# Altium schematic symbol library lib_datalogger.SchLib: 1246 symbols (part 15 of 16) (continued)
## CMP-00023-00001-2
designator U?, comment DS1307ZN+
I2C Real-Time Clock, 4.5 to 5.5 V, -40 to 85 degC, 8-Pin SOIC, RoHS, Tube; Manufacturer: Maxim; Max Supply Voltage: 5.5V; Min Supply Voltage: 4.5V; Outputs: 1; Package Version: Rev. D, 10/2012; Clock Frequency: 32.768KHz; Interface: Serial; Max Operating Temperature: 85°C; RoHS Compliant: True; Packaging: Rail/Tube; Manufacturer URL: http://www.maximintegrated.com/; Package Quantity: 100; Datasheet URL: http://datasheets.maximintegrated.com/en/ds/DS1307.pdf; Package Description: 8-Pin Small-Outline IC, Narrow (0.15in) (S8-2), Body 4.90 x 3.90 mm, Pitch 1.27 mm; Mounting Technology: SM; Package Reference: S8-2; Pins: 8; Case/Package: SOIC; Datasheet Version: Mar-15; Package URL: http://pdfserv.maximintegrated.com/package_dwgs/21-0041.PDF; Min Operating Temperature: -40°C
footprint MAXM-S8-2_L (SOIC, 8-Leads, Body 5x4mm, Pitch 1.27mm, IPC High Density)
footprint MAXM-S8-2_N (SOIC, 8-Leads, Body 5x4mm, Pitch 1.27mm, IPC Medium Density)
footprint MAXM-S8-2_M (SOIC, 8-Leads, Body 5x4mm, Pitch 1.27mm, IPC Low Density)
pins: 1 X1 "Connections for Standard 32.768kHz Quartz Crystal.", 2 X2 "Connections for Standard 32.768kHz Quartz Crystal.", 3 VBAT (power) "Backup Supply Input for Any Standard 3V Lithium Cell or Other Energy Source.", 4 GND (power) "Ground", 5 SDA (io) "Serial Data Input/Output.", 6 SCL (in) "Serial Clock Input.", 7 SQW/OUT (oc) "Square Wave/Output Driver.", 8 VCC (power) "Primary Power Supply."

## CMP-00023-00002-2
designator U?, comment LM555CM
Highly Stable 555 Timer for Generating Accurate Time Delays and Oscillation, 4.5 to 16 V, 0 to 70 degC, 8-Pin SOIC (D), Tube; Manufacturer: Texas Instruments (TI); Package Version: 4040047-3/M, 06/2011; Frequency: 100kHz; Max Supply Voltage: 16V; Max Ouput Current: -200mA; Min Supply Voltage: 4.5V; Power: 1.18W; Nominal Supply Current: 3mA; Channels: 1; Manufacturer URL: http://www.ti.com/; Pins: 8; Packaging: Rail/Tube; Datasheet Version: SNAS548D, 01/2015; RoHS Compliant: True; Package URL: http://www.ti.com/lit/ml/msoi002j/msoi002j.pdf; Package Reference: D0008A; Package Quantity: 95; Datasheet URL: http://www.ti.com/lit/ds/symlink/lm555.pdf; Min Operating Temperature: 0°C; Mounting Technology: SM; Max Operating Temperature: 70°C; Case/Package: SOIC; Package Description: 8-Pin Small Outline Integrated Circuit, Body 4.9 x 3.9 mm, Pitch 1.27 mm
footprint D0008A_L (SOIC, 8-Leads, Body 5x4mm, Pitch 1.27mm, IPC High Density)
footprint D0008A_N (SOIC, 8-Leads, Body 5x4mm, Pitch 1.27mm, IPC Medium Density)
footprint D0008A_M (SOIC, 8-Leads, Body 5x4mm, Pitch 1.27mm, IPC Low Density)
pins: 1 GND (power) "Ground reference voltage", 2 TRIGGER "Responsible for transition of the flip-flop from set to reset. The output of the timer depends on the amplitude of the external trigger pulse applied to this pin", 3 OUTPUT (out) "Output driven waveform", 4 RESET (in) "Negative pulse applied to this pin to disable or reset the timer. When not used for reset purposes, it should be connected to VCC to avoid false triggering", 5 CONTROL VOLTAGE (in) "Controls the threshold and trigger levels. It determines the pulse width of the output waveform. An external voltage applied to this pin can also be used to modulate the output waveform", 6 THRESHOLD "Compares the voltage applied to the terminal with a reference voltage of 2/3 Vcc. The amplitude of voltage applied to this terminal is responsible for the set state of the flip-flop", 7 DISCHARGE (oc) "Open collector output which discharges a capacitor between intervals (in phase with output). It toggles the output from high to low when voltage reaches 2/3 of the supply voltage", 8 V+ (power) "Supply voltage with respect to GND"

## CMP-023-000002-2
designator ANT?, comment ANTENA BL
Source: mits.SchLib; Design Item ID: ANTENA BL
footprint BL ANTENA ST
footprint BL ANTENA ST
pins: 1

## CMP-023-000003-1
designator MH?, comment PAD 5.5MM  (no BOM)
Design Item ID: PAD 5.5MM; Source: mits.SchLib
footprint PAD_5.5mm
footprint PAD_5.5mm
pins: HOLE "PAD"

## CMP-023-000004-1
designator U?, comment genericTLS
Source: mits.SchLib; Design Item ID: genericTLS
footprint genericTLS
footprint genericTLS

## CMP-023-000006-1
designator J?, comment JUMPER 0603  (no BOM)
Source: mits.SchLib; Design Item ID: JUMPER 0603
footprint JUMPER-0805 (Chip Capacitor)
footprint JUMPER-0603 (Chip Resistor; Body 1.6 x 0.8 mm (LxW typ))
pins: 1, 2

## CMP-023-000007-1
designator J?, comment JUMPER 0805  (no BOM)
JUMPER 0603; Source: mits.SchLib; Design Item ID: JUMPER 0805
footprint JUMPER-0805 (Chip Capacitor)
footprint JUMPER-0805 (Chip Capacitor)
pins: 1, 2

## CMP-023-000009-1
designator M?, comment BANDEJA RS-FA  (no BOM)
Manufacturer: MOBIT; Part#: BANDEJA RS-FA; Source: mits.SchLib; Design Item ID: BANDEJA RS-FA
footprint BANDEJA_RS3-FA
footprint BANDEJA_RS3-FA
1 alternate drawing of the same symbol

## CMP-023-000010-1
designator CON?, comment CONN_DG243-7.5
Design Item ID: CONN_DG243-7.5; Source: mits.SchLib
footprint CONN_TBL005A-500
footprint CONN_TBL005A-500
pins: 1_A 1, 1_B 1, 2_A 2, 2_B 2, 3_A 3, 3_B 3, 4_A 4, 4_B 4, 5_A 5, 5_B 5

## CMP-023-000011-1
designator U?, comment raspberry pi 3
Design Item ID: raspberry pi 3; Source: mits.SchLib
footprint raspberry
footprint raspberry

## CMP-023-000012-1
designator J?, comment JUMPER 0805 3POS  (no BOM)
JUMPER 0805; Design Item ID: JUMPER 0805 3POS; Source: mits.SchLib
footprint JUMPER-3POS (Chip Capacitor)
footprint JUMPER-3POS (Chip Capacitor)
pins: 1, 2, 3

## CMP-023-000018-1
designator U?, comment IC ESP32-WROOM-32D
WIFI Module WIFI Modules RoHS; Manufacturer_Name: Espressif Systems; Data Rate: 150Mbps; Operating Supply Voltage: 3.6V; Frequency: 2.5GHz; Sensitivity: -98dBm; Min Operating Temperature: -40°C; Manufacturer_Part_Number: ESP32-WROOM-32D; Mouser Part Number: N/A; Max Operating Temperature: 85°C; Mount: Surface Mount; Height: 3.1mm; Datasheet Link: https://www.mouser.com/datasheet/2/891/esp32-wroom-32d_esp32-wroom-32u_datasheet_en-1365844.pdf; Package Quantity: 550; Packaging: Cut Tape; Supplier Unit Price 1: 2.3204; Design Item ID: IC ESP32-WROOM-32D; Case/Package: SMD/SMT; Mouser Price/Stock: https://www.mouser.co.uk/ProductDetail/Espressif-Systems/ESP32-WROOM-32D/?qs=MLItCLRbWszx2KabkKPu5A%3D%3D; Source: mits.SchLib; Weight: 0.088185oz; Manufacturer Part Number 1: ESP32-WROOM-32; Category: RF Receivers, Transceivers; Manufacturer 1: Espressif Systems
footprint ESP32WROOM32D
footprint ESP32WROOM32D
pins: 1 GND_1, 2 3V3, 3 EN, 4 SENSOR_VP, 5 SENSOR_VN, 6 IO34, 7 IO35, 8 IO32, 9 IO33, 10 IO25, 11 IO26, 12 IO27, 13 IO14, 14 IO12, 15 GND_2, 16 IO13, 17 SD2, 18 SD3, 19 CMD, 20 CLK, 21 SD0, 22 SD1, 23 IO15, 24 IO2, 25 IO0, 26 IO4, 27 IO16, 28 IO17, 29 IO5, 30 IO18, 31 IO19, 32 NC, 33 IO21, 34 RXD0, 35 TXD0, 36 IO22, 37 IO23, 38 GND_3, 39 GND_4

## CMP-023-000020-1
designator MH?, comment OBILONGO 4MMX11.5MM  (no BOM)
Source: mits.SchLib; Design Item ID: OBILONGO 4MMX11.5MM
footprint OBILONGO_4mmX10.5mm
footprint OBILONGO_4mmX10.5mm
pins: HOLE "PAD"

## CMP-023-000021-1
designator ARJ?, comment CONNECTOR 5 JUMPERS ARRAY  (no BOM)
Design Item ID: CONNECTOR 5 JUMPERS ARRAY; Source: mits.SchLib
footprint JUMPER-0603 (Chip Resistor; Body 1.6 x 0.8 mm (LxW typ))
footprint JUMPER-0603 (Chip Resistor; Body 1.6 x 0.8 mm (LxW typ))
pins: 1, 2, 3, 4, 5, 6, 7, 8, 9, 10

## CMP-023-000022-2
designator J?, comment JUMPER PLUG 2POS DOUBLE ROW
Manufacturer Part Number: XG8T-0231; Manufacturer: Omron Electronics Inc-EMC Div; Number of Positions: 2; Contact Length - Mating: 0.169" (4.30mm); Material Flammability Rating: UL94 V-0; Overall Contact Length: 0.386" (9.80mm); Contact Length - Post: 0.118" (3.00mm); Current Rating: 2A; Connector Type: Header; Number of Positions Loaded: All; Style: Board to Board or Cable; Row Spacing - Mating: 0.100" (2.54mm); Voltage Rating: 300V; Shrouding: Unshrouded; Contact Finish - Mating: Gold; Applications: -; Operating Temperature: -55°C ~ 105°C; Manufacturer Part Number 2: MTP125-1102S1; Contact Material: Brass, Nickel; Termination: Solder; Source: mits.SchLib; Features: -; Pitch - Mating: -; Design Item ID: JUMPER PLUG 2POS DOUBLE ROW; Contact Finish Thickness - Post: -; Part Status: Active; Ingress Protection: -; Packaging: Bulk; RoHS: RoHS Compliant; Mounting Type: Through Hole; Contact Type: Male Pin; Insulation Color: Black; Manufacturer 2: MINTRON; Contact Finish Thickness - Mating: 5.9µin (0.15µm); ComponentLink1URL: http://www.omron.com/ecb/products/pdf/en-xj8.pdf; Fastening Type: -; Category: Connectors, Interconnects; Supplier Unit Price 2: 0.0063; Insulation Material: Polybutylene Terephthalate (PBT), Glass Filled; Number of Rows: 2; ComponentLink1Description: http://www.omron.com/ecb/products/pdf/en-xj8.pdf; Contact Shape: Square; Pricing 1: 1=0.19, 10=0.18, 100=0.1245, 500=0.10534, 1000=0.08618, 5000=0.07661, 10000=0.06943 (USD); Insulation Height: 0.098" (2.50mm); Stock 1: 16469; Contact Finish - Post: Tin; Mated Stacking Heights: -
footprint JUMPER 2POS 2.54MM (Connector; Header; 2 Position)
footprint JUMPER 2POS 2.54MM (Connector; Header; 2 Position)
pins: 1 C1, 2 C2

## CMP-023-000024-1
designator U?, comment COPO  LIGHT CONTROLLER COVER
LED Lighting Fixture Accessories; COVER; LIGHT CONTROLLER; 76MM DIA; MEDIUM; Manufacturer Part Number: 2213748-1; Manufacturer: TE Connectivity; REACH SVHC: Unknown; RoHS: Yes; ComponentLink2URL: http://www.farnell.com/datasheets/2079116.pdf?src-supplier=Element14; ComponentLink1Description: https://www.te.com/commerce/DocumentDelivery/DDEController?Action=srchrtrv&amp;DocNm=2213748&amp;DocType=Customer+Drawing&amp;DocLang=English&src-supplier=Digi-Key; Source: mits.SchLib; Stock 1: 14; ComponentLink1URL: https://www.te.com/commerce/DocumentDelivery/DDEController?Action=srchrtrv&amp;DocNm=2213748&amp;DocType=Customer+Drawing&amp;DocLang=English&src-supplier=Digi-Key; Design Item ID: COPO  LIGHT CONTROLLER COVER; ComponentLink2Description: http://www.farnell.com/datasheets/2079116.pdf?src-supplier=Element14; Pricing 1: 1=8,03000, 10=5,82600, 100=4,81440, 500=4,33940 (USD); Category: Optoelectronics; Housing Color: Grey

## CMP-023-000025-1
designator Fs?, comment FUSE 250V 2A IEC FA LBC 5X20
Manufacturer: Littelfuse Inc; Part#: 0217002.HXP; eVendorPrice: 0,35; eVendor#: F2393-ND; eVendor: Digikey; MSRP: 0,1456; MOQ: 2500; Observação: --; Datasheet: http://www.littelfuse.com/~/media/electronics/datasheets/fuses/littelfuse_fuse_217_datasheet.pdf.pdf; Design Item ID: FUSE 250V 2A IEC FA LBC 5X20; Source: mits.SchLib
footprint FUSE
footprint FUSE

## CMP-023-000026-1
designator RT?, comment PTC RESETTABLE 16V 3A RADIAL
Manufacturer: Littelfuse; Manufacturer Part Number: RF2775-000; Trip Current: 6A; Time to Trip: 10.8s; Approvals: UL,TUV,cURus; Max Current Rating: 100A; ComponentLink1Description: http://www.te.com/commerce/DocumentDelivery/DDEController?Action=srchrtrv&DocNm=SCD25175&DocType=SS&DocLang=EN&src-supplier=Digi-Key; Height - Seated (Max): 0.65inch; Max Operating Temperature: 125°C; Mount: Through Hole; Length: 0.449inch; ComponentLink2URL: https://media.digikey.com/pdf/Data%20Sheets/Bel%20Fuse%20PDFs/0ZRN_Series.pdf?src-supplier=Digi-Key; Case/Package: Radial; Lead Pitch: 0.199inch; Pricing 2: 1=0,46000, 5=0,45000, 10=0,43700, 50=0,36720, 100=0,30490, 250=0,27720, 500=0,23562, 1000=0,20790, 5000=0,18711 (USD); Packaging: Tape and Reel; Hold Current: 3A; Min Operating Temperature: -40°C; Pricing 1: 1=0,53000, 5=0,51600, 10=0,50100, 50=0,42140, 100=0,34980, 250=0,31800, 500=0,27030 (USD); Stock 1: 1100; ComponentLink1URL: http://www.te.com/commerce/DocumentDelivery/DDEController?Action=srchrtrv&DocNm=SCD25175&DocType=SS&DocLang=EN&src-supplier=Digi-Key; Width: 0.118inch; Design Item ID: PTC RESETTABLE 16V 3A RADIAL; RoHS: Yes; Source: mits.SchLib; Stock 2: 2912; ComponentLink2Description: https://media.digikey.com/pdf/Data%20Sheets/Bel%20Fuse%20PDFs/0ZRN_Series.pdf?src-supplier=Digi-Key; Category: PTC Resettable Fuses
footprint PTC_TH (Jumper Wire; 2 Leads)
footprint PTC_TH 5.1-12 (Jumper Wire; 2 Leads)
pins: 1, 2
text: t°

## CMP-023-000027-1
designator RT?, comment PTC RESETTABLE 30V 3A RADIAL
PTC RESET FUSE 30V 3A RADIAL; Manufacturer: Littelfuse; Manufacturer Part Number: RF2775-000; Time to Trip: 10.8s; Trip Current: 6A; Max Current Rating: 100A; ComponentLink1Description: http://www.te.com/commerce/DocumentDelivery/DDEController?Action=srchrtrv&DocNm=SCD25175&DocType=SS&DocLang=EN&src-supplier=Digi-Key; Case/Package: Radial; Lead Pitch: 0.199inch; RoHS: Yes; Height - Seated (Max): 0.65inch; Source: mits.SchLib; Hold Current: 3A; Packaging: Tape and Reel; Design Item ID: PTC RESETTABLE 30V 3A RADIAL; Stock 1: 1100; ComponentLink1URL: http://www.te.com/commerce/DocumentDelivery/DDEController?Action=srchrtrv&DocNm=SCD25175&DocType=SS&DocLang=EN&src-supplier=Digi-Key; Category: PTC Resettable Fuses; Length: 0.449inch; Width: 0.118inch; Pricing 1: 1=0,53000, 5=0,51600, 10=0,50100, 50=0,42140, 100=0,34980, 250=0,31800, 500=0,27030 (USD); Mount: Through Hole
footprint PTC_TH (Jumper Wire; 2 Leads)
footprint PTC_TH 5.1-12 (Jumper Wire; 2 Leads)
pins: 1, 2
text: t°

## CMP-023-000028-1
designator RT?, comment PTC RESETTABLE 30V 6A RADIAL
Ptc Reset Fuse 30V 6A Radial; Manufacturer Part Number: RF2754-000; Manufacturer: Littelfuse; Time to Trip: 16s; Max Current Rating: 100A; Trip Current: 12A; Case/Package: Radial; Source: mits.SchLib; Width: 0.118inch; Design Item ID: PTC RESETTABLE 30V 6A RADIAL; RoHS: Yes; Stock 1: 2074; Length: 0.65inch; Packaging: Tape and Reel; Pricing 1: 1=0,82000, 5=0,79600, 10=0,77200, 50=0,64920, 100=0,53900, 250=0,49000, 500=0,41650 (USD); ComponentLink1Description: http://www.te.com/commerce/DocumentDelivery/DDEController?Action=srchrtrv&DocNm=CLP00011&DocType=CS&DocLang=English&src-supplier=Digi-Key; Category: PTC Resettable Fuses; Height - Seated (Max): 1.031inch; Lead Pitch: 0.4inch; ComponentLink1URL: http://www.te.com/commerce/DocumentDelivery/DDEController?Action=srchrtrv&DocNm=CLP00011&DocType=CS&DocLang=English&src-supplier=Digi-Key; Hold Current: 6A; Mount: Through Hole
footprint PTC_TH (Jumper Wire; 2 Leads)
footprint PTC_TH 5.1%2F10.2 - 23 (Jumper Wire; 2 Leads)
pins: 1, 2
text: t°

## CMP-023-000029-1
designator IPD?, comment IC RF FILTER LFB182G45BG2D280
Signal Conditioning 2.4GHz Bandpass TI CC253x CC254x; Manufacturer: Murata; Bandwidth: 2.45GHz; Impedance: 50R; Insertion Loss: 0.75dB; Frequency: 2.4GHz; Package Quantity: 4000; Case/Package: 0603; Source: mits.SchLib; Series: LFB; Pricing 1: 1=0,29090, 10=0,21420, 30=0,20010, 100=0,18590, 500=0,17970, 1000=0,17670, 1=0,28040, 10=0,20650, 30=0,19280, 100=0,17920, 500=0,17320, 1000=0,17030, 1=1,45420, 10=1,07080, 30=1,00020, 100=0,92950, 500=0,89810, 1000=0,88310, 1=1,40180, 10=1,03220, 30=0,96410, 100=0,89600, 500=0,86580, 1000=0,85130, 1=0,18800, 10=0,13840, 30=0,12930, 100=0,12020, 500=0,11610, 1000=0,11420, 1=0,16120, 10=0,11870, 30=0,11090, 100=0,10300, 500=0,09960, 1000=0,09790, 1=1,72710, 10=1,27180, 30=1,18790, 100=1,10400, 500=1,06670, 1000=1,04890, 1=24,36720, 10=17,94380, 30=16,76000, 100=15,57620, 500=15,05000, 1000=14,79790, 1=0,92180, 10=0,67880, 30=0,63400, 100=0,58920, 500=0,56930, 1000=0,55980, 1=16,89790, 10=12,44350, 30=11,62250, 100=10,80160, 500=10,43670, 1000=10,26190, 1=1,92070, 10=1,41440, 30=1,32110, 100=1,22780, 500=1,18630, 1000=1,16640, 1=0,29920, 10=0,22030, 30=0,20580, 100=0,19130, 500=0,18480, 1000=0,18170, 1=0,22230, 10=0,16370, 30=0,15290, 100=0,14210, 500=0,13730, 1000=0,13500 (AUD); Radiation Hardening: No; Length: 1.6mm; Width: 800um; Termination: SMD/SMT; RoHS Compliant: Yes; Design Item ID: IC RF FILTER LFB182G45BG2D280; Category: EMI / RFI Components; Manufacturer Part Number: LFB182G45BG2D280; RoHS: Yes; Max Operating Temperature: 85°C; ComponentLink1URL: https://datasheet.ciiva.com/4547/dm-5400-01a-lfb182g45bg2d280-202913-4547754.pdf?src-supplier=Mouser; Packaging: Tape and Reel; Stock 1: 23214; ComponentLink1Description: https://datasheet.ciiva.com/4547/dm-5400-01a-lfb182g45bg2d280-202913-4547754.pdf?src-supplier=Mouser; Min Operating Temperature: -40°C
footprint SMD RF 0603
footprint SMD RF 0603
pins: 1 Unbalanced Port, 2 GND (power), 3 Balanced Port, 4 Balanced Port, 5 GND (power), 6 GND

## CMP-023-000030-1
designator RT?, comment PTC RESETTABLE 16V 15A RADIAL
PTC RESET FUSE 16V 15A RADIAL; Manufacturer: Littelfuse; Manufacturer Part Number: RHEF1500-2; Time to Trip: 20s; Max Current Rating: 100A; Trip Current: 28A; Approvals: UL,CSA,TUV; Pricing 1: 1=1,58000, 5=1,50000, 10=1,42500, 50=1,15000, 100=0,97500, 250=0,95000, 500=0,80000 (USD); ComponentLink1Description: http://www.littelfuse.com/~/media/electronics/datasheets/resettable_ptcs/littelfuse_ptc_rline_catalog_datasheet.pdf.pdf?src-supplier=Digi-Key; Lead Free: Lead Free; Source: mits.SchLib; Length: 28.7mm; ComponentLink1URL: http://www.littelfuse.com/~/media/electronics/datasheets/resettable_ptcs/littelfuse_ptc_rline_catalog_datasheet.pdf.pdf?src-supplier=Digi-Key; ComponentLink3Description: https://www.littelfuse.com/~/media/electronics/product_specifications/resettable_ptcs/littelfuse_ptc_rhef1500_product_specification.pdf.pdf?src-supplier=Digi-Key; Packaging: Cut Tape; RoHS: No; Design Item ID: PTC RESETTABLE 16V 15A RADIAL; Voltage Rating (DC): 16V; ComponentLink2URL: http://www.littelfuse.com/~/media/electronics/product_specifications/resettable_ptcs/littelfuse_ptc_rhef1500_product_specification.pdf.pdf?src-supplier=Digi-Key; Stock 1: 1747; ComponentLink2Description: http://www.littelfuse.com/~/media/electronics/product_specifications/resettable_ptcs/littelfuse_ptc_rhef1500_product_specification.pdf.pdf?src-supplier=Digi-Key; Hold Current: 15A; Category: PTC Resettable Fuses; Min Operating Temperature: -40°C; Case/Package: Radial; Mount: Through Hole; Max Operating Temperature: 125°C; ComponentLink3URL: https://www.littelfuse.com/~/media/electronics/product_specifications/resettable_ptcs/littelfuse_ptc_rhef1500_product_specification.pdf.pdf?src-supplier=Digi-Key
footprint PTC_TH (Jumper Wire; 2 Leads)
footprint PTC_TH 5.1%2F10.2 - 23 (Jumper Wire; 2 Leads)
pins: 1, 2
text: t°

## CMP-023-000031-1
designator RT?, comment PTC RESETTABLE 60V 1.6A RADIAL
PTC RESET FUSE 60V 1.6A RADIAL; Manufacturer Part Number: 0ZRE0200FF1A; Manufacturer: Bel; Time to Trip: 15.6s; Resistance: 130mR; Hold Current: 2.5A; Max Current Rating: 40A; Power Dissipation: 2.5W; Approvals: cULus,TUV; Trip Current: 5A; Termination: Radial; ComponentLink3Description: https://datasheet.ciiva.com/14119/iewickmann-resettables-rld60-en-14119709.pdf?src-supplier=Distrelec; Pricing 2: 1=0,40000, 5=0,38600, 10=0,37400, 50=0,31480, 100=0,26140, 250=0,23760, 500=0,20196, 1000=0,17820, 5000=0,16038 (USD); ComponentLink6Description: https://datasheet.ciiva.com/16409/littelfuse-ptc-60r-16409062.pdf?src-supplier=Future+Electronics; Height: 21.3mm; ComponentLink9Description: https://media.digikey.com/pdf/Data%20Sheets/Bel%20Fuse%20PDFs/0ZRR_Series.pdf?src-supplier=Digi-Key; Lead Free: Lead Free; ComponentLink1Description: https://belfuse.com/resources/0ZRE%20Sep2016.pdf?src-supplier=Digi-Key; Case/Package: Radial; Width: 16.3mm; Mount: Through Hole; ComponentLink2Description: https://datasheet.ciiva.com/326/littelfuse-60r-326981.pdf?src-supplier=Digi-Key; Package Quantity: 1000; Stock 1: 413; Design Item ID: PTC RESETTABLE 60V 1.6A RADIAL; Max Voltage Rating (DC): 60V; ComponentLink3URL: https://datasheet.ciiva.com/14119/iewickmann-resettables-rld60-en-14119709.pdf?src-supplier=Distrelec; Source: mits.SchLib; Category: PTC Resettable Fuses; ComponentLink2URL: https://datasheet.ciiva.com/326/littelfuse-60r-326981.pdf?src-supplier=Digi-Key; ComponentLink6URL: https://datasheet.ciiva.com/16409/littelfuse-ptc-60r-16409062.pdf?src-supplier=Future+Electronics; Min Operating Temperature: -40°C; Thickness: 3.05mm; Current Rating: 40A; ComponentLink5URL: https://datasheet.ciiva.com/326/littelfuse-60r-326806.pdf?src-supplier=Digi-Key; ComponentLink8Description: https://datasheet.ciiva.com/14119/iewickmann-resettables-rld60-en-14119707.pdf?src-supplier=Distrelec; Lead Pitch: 10.2mm; ComponentLink4Description: https://datasheet.ciiva.com/326/littelfuse-60r-326982.pdf?src-supplier=Digi-Key; ComponentLink5Description: https://datasheet.ciiva.com/326/littelfuse-60r-326806.pdf?src-supplier=Digi-Key; Pricing 1: 1=0,55000, 5=0,53600, 10=0,52000, 50=0,43720, 100=0,36300, 250=0,33000, 500=0,28050 (USD); RoHS: No; ComponentLink7URL: https://datasheet.ciiva.com/326/littelfuse-60r-326807.pdf?src-supplier=Digi-Key; ComponentLink4URL: https://datasheet.ciiva.com/326/littelfuse-60r-326982.pdf?src-supplier=Digi-Key; ComponentLink7Description: https://datasheet.ciiva.com/326/littelfuse-60r-326807.pdf?src-supplier=Digi-Key; Max Operating Temperature: 85°C; Working Voltage: 60V; Stock 2: 906; ComponentLink1URL: https://belfuse.com/resources/0ZRE%20Sep2016.pdf?src-supplier=Digi-Key; ComponentLink8URL: https://datasheet.ciiva.com/14119/iewickmann-resettables-rld60-en-14119707.pdf?src-supplier=Distrelec; ComponentLink9URL: https://media.digikey.com/pdf/Data%20Sheets/Bel%20Fuse%20PDFs/0ZRR_Series.pdf?src-supplier=Digi-Key; Packaging: Tape and Reel
footprint PTC_TH (Jumper Wire; 2 Leads)
footprint PTC_TH 5.1%2F10.2 (Jumper Wire; 2 Leads)
pins: 1, 2
text: t°

## CMP-023-000032-1
designator RT?, comment PTC RESETTABLE 60V 2.5A RADIAL
PTC RESETTABLE 60V 2.50A KINKAMO; Manufacturer: Bel; Manufacturer Part Number: 0ZRE0200FF1A; Approvals: cULus,TUV; Trip Current: 5A; Current Rating: 40A; Time to Trip: 15.6s; Power Dissipation: 2.5W; Resistance: 130mR; Stock 2: 1145; Source: mits.SchLib; Lead Free: Lead Free; Stock 1: 1518; ComponentLink2Description: https://datasheet.ciiva.com/326/littelfuse-60r-326981.pdf?src-supplier=Digi-Key; Package Quantity: 1000; Max Voltage Rating (DC): 60V; Pricing 1: 1=0,96000, 5=0,93400, 10=0,87400, 50=0,72340, 100=0,60280, 250=0,58772, 500=0,49732, 1000=0,43703, 5000=0,39182 (USD); Category: PTC Resettable Fuses; Max Operating Temperature: 85°C; Case/Package: Radial; ComponentLink4Description: https://datasheet.ciiva.com/326/littelfuse-60r-326982.pdf?src-supplier=Digi-Key; Max Current Rating: 40A; Lead Pitch: 10.2mm; ComponentLink4URL: https://datasheet.ciiva.com/326/littelfuse-60r-326982.pdf?src-supplier=Digi-Key; Termination: Radial; Packaging: Tape and Reel; ComponentLink3Description: https://datasheet.ciiva.com/14119/iewickmann-resettables-rld60-en-14119709.pdf?src-supplier=Distrelec; Pricing 2: 1=0,65000, 5=0,63400, 10=0,61400, 50=0,51680, 100=0,42900, 250=0,39000, 500=0,33150 (USD); Design Item ID: PTC RESETTABLE 60V 2.5A RADIAL; Min Operating Temperature: -40°C; RoHS: No; ComponentLink1URL: https://belfuse.com/resources/0ZRE%20Sep2016.pdf?src-supplier=Digi-Key; ComponentLink2URL: https://datasheet.ciiva.com/326/littelfuse-60r-326981.pdf?src-supplier=Digi-Key; Hold Current: 2.5A; ComponentLink1Description: https://belfuse.com/resources/0ZRE%20Sep2016.pdf?src-supplier=Digi-Key; ComponentLink3URL: https://datasheet.ciiva.com/14119/iewickmann-resettables-rld60-en-14119709.pdf?src-supplier=Distrelec
footprint PTC_TH (Jumper Wire; 2 Leads)
footprint PTC_TH (Jumper Wire; 2 Leads)
pins: 1, 2
text: t°

## CMP-023-000033-1
designator U?, comment ANTENNA 915MHZ RP-SMA RIGHT ANGLE
Antennas RPSMA RAng Reducd Ht 1/4 Wave Whip 916MHz; Manufacturer Part Number: ANT-916-CW-RCS; Manufacturer: Linx; Number of Bands: 1; VSWR: 1.9; Impedance: 50R; Bandwidth: 150MHz; Pricing 1: 1=7,47000, 10=7,21000, 50=6,93000, 100=6,82000, 1000=5,71000, 10000=5,71000 (USD); Series: RCS; Source: mits.SchLib; Category: RF Antennas; Design Item ID: ANTENNA 915MHZ RP-SMA RIGHT ANGLE; ComponentLink1Description: https://datasheet.ciiva.com/4432/ant-916-cw-rcs-data-sheet-17650-4432477.pdf?src-supplier=Mouser; RoHS: Yes; Diameter: 7.11mm; Lead Free: Lead Free; ComponentLink2URL: https://datasheet.ciiva.com/2792/ant-916-cw-rcs-2792330.pdf?src-supplier=Digi-Key; ComponentLink1URL: https://datasheet.ciiva.com/4432/ant-916-cw-rcs-data-sheet-17650-4432477.pdf?src-supplier=Mouser; Frequency: 916MHz; Termination: SMA; Mount: Connector; Package Quantity: 100; Length: 45mm; ComponentLink2Description: https://datasheet.ciiva.com/2792/ant-916-cw-rcs-2792330.pdf?src-supplier=Digi-Key; RoHS Compliant: Yes; Height: 2.106inch; Packaging: Bulk; Stock 1: 102
footprint ANTENNA_RF_RPA-SMA_RIGHT_ANGLE
footprint ANTENNA_RF_RPA-SMA_RIGHT_ANGLE
pins: 0

## CMP-023-000034-1
designator U?, comment DGTL ISO 1540DR 4KV 2CH I²C SOIC8
TEXAS INSTRUMENTS - ISO1540DR - DIGITAL ISOLATOR, 2-CH, 1MBPS, SOIC-8; Propagation Delay: 70ns; Working Voltage: 566V; Number of Channels: 2; Isolated Power: No; Max Supply Voltage: 5.5V; Pulse Width Distortion (PWD): 21ns; Nominal Supply Current: 3.6mA; Min Supply Voltage: 3V; Channel Type: Bidirectional; Source: mits.SchLib; Packaging: Tape and Reel; Manufacturer Part Number: ISO1540DR; REACH SVHC: No SVHC; Min Operating Temperature: -40°C; Manufacturer: Texas Instruments; Pricing 1: 1=4,25760, 10=3,67740, 30=3,57120, 100=3,46510, 500=3,41790, 1000=3,39430, 1=4,09830, 10=3,53980, 30=3,43760, 100=3,33550, 500=3,29000, 1000=3,26730, 1=21,38630, 10=18,47170, 30=17,93820, 100=17,40540, 500=17,16820, 1000=17,04990, 1=20,55890, 10=17,75710, 30=17,24420, 100=16,73200, 500=16,50400, 1000=16,39030, 1=2,76460, 10=2,38780, 30=2,31890, 100=2,25000, 500=2,21930, 1000=2,20400, 1=2,36330, 10=2,04120, 30=1,98230, 100=1,92340, 500=1,89720, 1000=1,88410, 1=25,30310, 10=21,85470, 30=21,22350, 100=20,59300, 500=20,31240, 1000=20,17250, 1=357,61220, 10=308,87580, 30=299,95480, 100=291,04470, 500=287,07850, 1000=285,10090, 1=13,48860, 10=11,65030, 30=11,31380, 100=10,97780, 500=10,82820, 1000=10,75360, 1=246,24230, 10=212,68380, 30=206,54100, 100=200,40570, 500=197,67470, 1000=196,31300, 1=28,26840, 10=24,41590, 30=23,71070, 100=23,00640, 500=22,69290, 1000=22,53650, 1=4,38810, 10=3,79000, 30=3,68060, 100=3,57130, 500=3,52260, 1000=3,49830, 1=3,25500, 10=2,81140, 30=2,73020, 100=2,64910, 500=2,61300, 1000=2,59500 (AUD); ComponentLink2Description: https://datasheet.ciiva.com/6579/iso1540-6579725.pdf?src-supplier=Digi-Key; Case/Package: SOIC; Mount: Surface Mount; Lead Free: Lead Free; ComponentLink3URL: https://datasheet.ciiva.com/14196/iso1540-14196749.pdf?src-supplier=Avnet; ComponentLink1URL: https://datasheet.ciiva.com/6579/iso1540-6579724.pdf?src-supplier=Digi-Key; RoHS Compliant: Yes; ComponentLink2URL: https://datasheet.ciiva.com/6579/iso1540-6579725.pdf?src-supplier=Digi-Key; Design Item ID: DGTL ISO 1540DR 4KV 2CH I²C SOIC8; ComponentLink1Description: https://datasheet.ciiva.com/6579/iso1540-6579724.pdf?src-supplier=Digi-Key; Stock 1: 322; Number of Pins: 8; RoHS: Yes; Manufacturer_Part_Number: ISO1540DR; Series: -; Max Operating Temperature: 125°C; Data Rate: 1Mbps; ComponentLink3Description: https://datasheet.ciiva.com/14196/iso1540-14196749.pdf?src-supplier=Avnet; Supply Current: 3.6mA; ComponentLink4Description: https://datasheet.ciiva.com/6579/iso1540-6579723.pdf?src-supplier=Digi-Key; Manufacturer_Name: Texas Instruments; Height: 1.75mm; ComponentLink4URL: https://datasheet.ciiva.com/6579/iso1540-6579723.pdf?src-supplier=Digi-Key; Arrow Part Number: ISO1540DR; Datasheet Link: http://www.ti.com/lit/ds/symlink/iso1540.pdf; Package Quantity: 1; Category: Interface ICs
footprint SOIC-8
footprint SOIC-8
pins: 1 VCC1, 2 SDA1, 3 SCL1, 4 GND1, 5 GND2, 6 SCL2, 7 SDA2, 8 VCC2

## CMP-023-000035-1
designator U?, comment DGTL ISO ADUM163N1BRZ 3KV 6CH GEN PURP 16SOIC SMD
DGTL ISO 3KV 6CH GEN PURP 16SOIC; Manufacturer: Analog Devices Inc.; Propagation Delay tpLH / tpHL (Max): 13ns, 13ns; Inputs - Side 1/Side 2: 3/3; Voltage - Supply: 1.7 V ~ 5.5 V; Number of Channels: 6; Pulse Width Distortion (Max): 4.5ns; Rise / Fall Time (Typ): 2.5ns, 2.5ns; Common Mode Transient Immunity (Min): 75kV/µs; Isolated Power: No; Voltage - Isolation: 3000Vrms; Channel Type: Unidirectional; Data Rate: 150Mbps; Package / Case: 16-SOIC (0.154", 3.90mm Width); Supplier Device Package: 16-SOIC; Technology: Magnetic Coupling; Operating Temperature: -40°C ~ 125°C; Pricing 1: 1=8.38, 48=7.21542, 144=6.26514, 528=5.45561, 1008=4.75167 (USD); Design Item ID: DGTL ISO ADUM163N1BRZ 3KV 6CH GEN PURP 16SOIC SMD; Stock 1: 41; Part Status: Active; ComponentLink1Description: http://www.analog.com/media/en/technical-documentation/data-sheets/ADuM160N-161N-162N-163N.pdf; Category: Isolators; Type: General Purpose; Source: mits.SchLib; ComponentLink1URL: http://www.analog.com/media/en/technical-documentation/data-sheets/ADuM160N-161N-162N-163N.pdf; Manufacturer Part Number: ADUM163N1BRZ; RoHS: RoHS Compliant; Packaging: Tube
footprint 16-SOIC(W)
footprint 16-SOIC(W)
pins: 1 VDD1 (power), 2 VIA (in), 3 VIB (in), 4 VIC (in), 5 VOD (out), 6 VOE (out), 7 VOF (out), 8 GND1 (power), 9 GND2 (power), 10 VIF (in), 11 VIE (in), 12 VID (in), 13 VOC (out), 14 VOB (out), 15 VOA (out), 16 VDD2 (power)

## CMP-023-000036-1
designator U?, comment DGTL ISO MAX14936 5KV 4CH 16SOIC
DGTL ISO 5KV 4CH 16SOIC; Part#: MAX14936BAWE+; Manufacturer: Maxim Integrated; eVendor: Digi-Key; MSRP: 3,20; eVendor#: MAX14936BAWE+-ND; eVendorPrice: 3,25; Design Item ID: DGTL ISO MAX14936 5KV 4CH 16SOIC; Obs: -; MOQ: 10; Datasheet: http://datasheets.maximintegrated.com/en/ds/MAX14934-MAX14936.pdf; Source: mits.SchLib
pins: 1 VDDA (power) "Power Supply. Bypass VDDA with a 0.1µF ceramic capacitor as close as possible to the pin.", 2 GNDA (power) "Ground Reference for Side A", 2 ENB (in), 3 INA1 (in) "Logic Input 1 on Side A. INA1 corresponds to OUTB1.", 4 INA2 (in) "Logic Input 2 on Side A. INA2 corresponds to OUTB2.", 7 ENA (in), 8 GNDA (power) "Ground Reference for Side A", 11 GNDB (power), 11 INB1 (in), 11 INB2 (in), 16 OUTA1 (out), 17 OUTA2 (out), 17 OUTB1 (out), 18 OUTB2 (out), 20 VDDB (power)
